# Altium footprint library NUCLEOG431RB-Custom-IN-A2212.PcbLib: 80 footprints (part 1 of 5)
Each footprint in its own frame and in the unit in brackets; x right, y up, seen from the top. Pads: shape width x height; smd on the part's side, far side on the other; paste and mask are expansions set on the pad; w line width, h text height; cw(c..) or ccw(c..) is an arc to the next point about the centre after c.
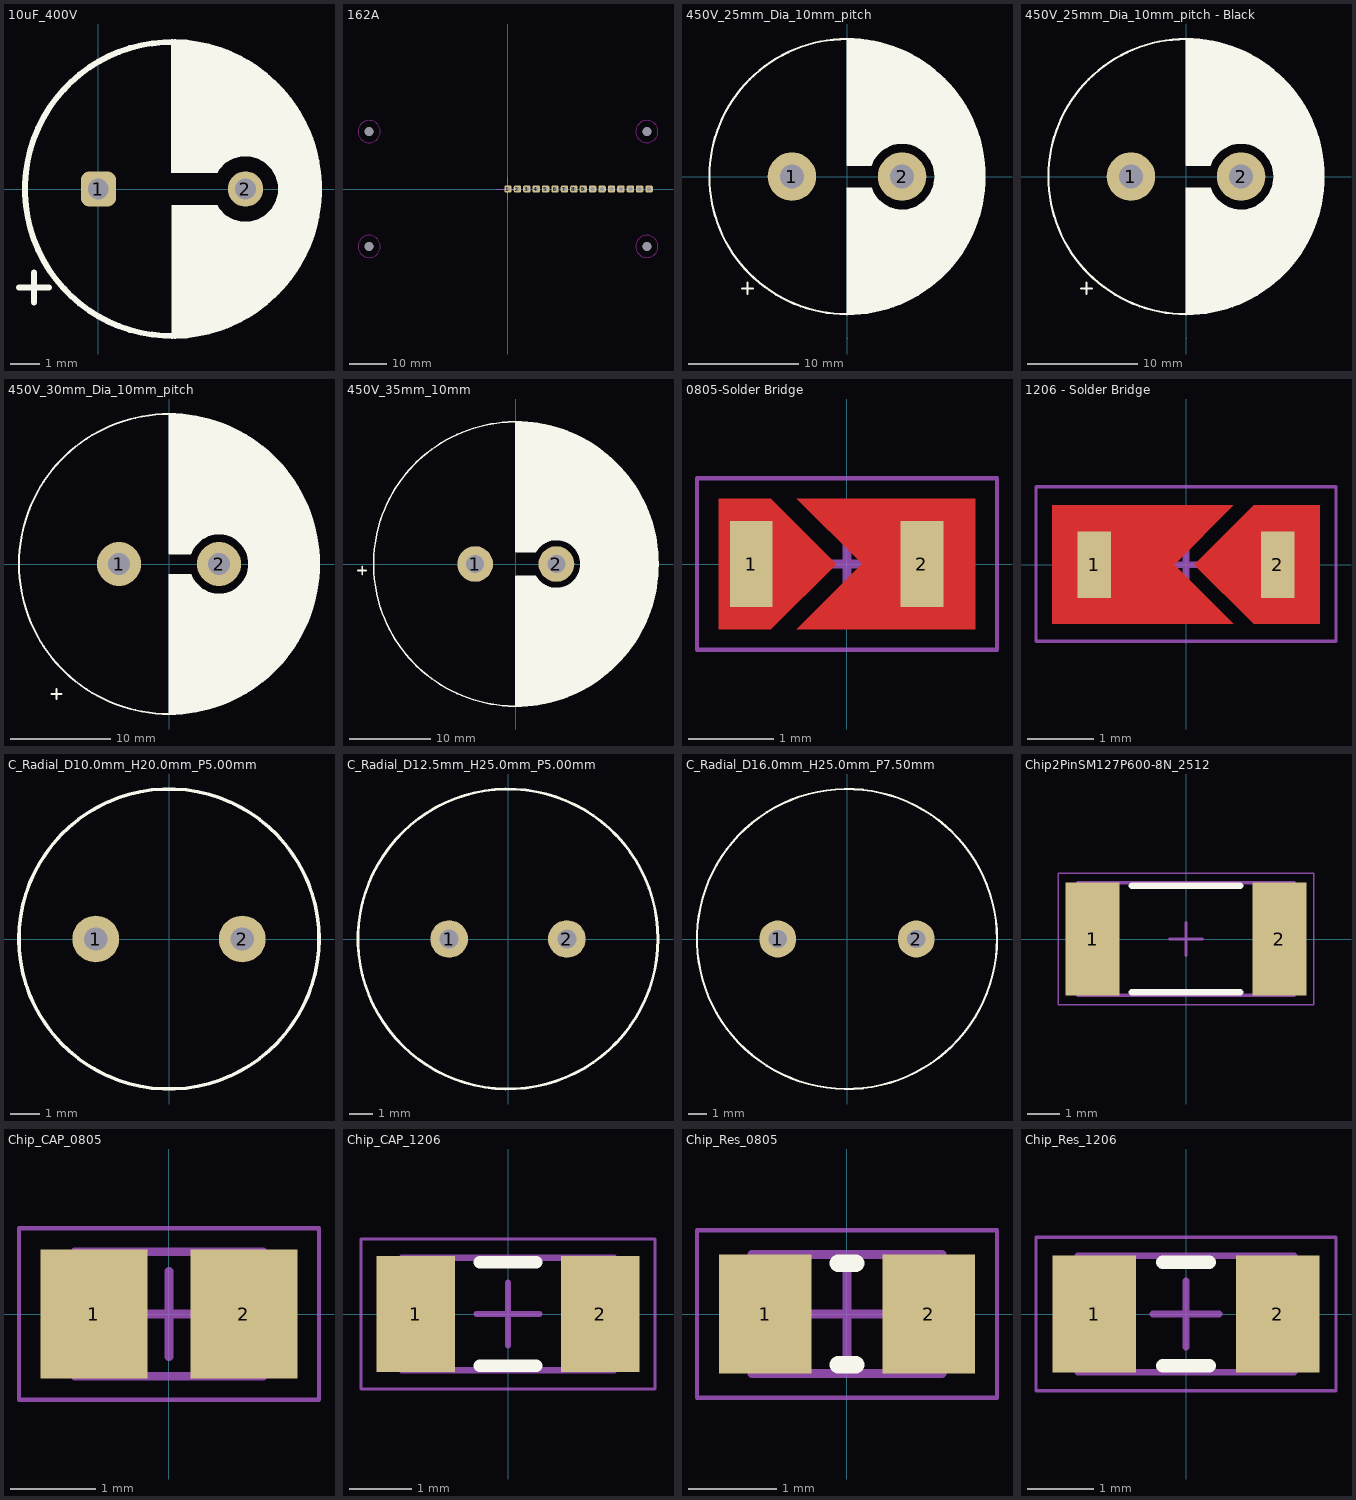
[diagram p0: the footprints below, top view; thin cyan lines are the x and y axes]

## 10uF_400V [mm]
pads (2):
  rrect50% 1.2x1.2 hole 0.7: 1(0,0)
  round 1.2 hole 0.7: 2(5,0)
Top Overlay:
  circle w0.2: c2.5,0 r5
  region: 2.5,-5 2.828,-5 3.478,-4.914 4.111,-4.745 4.716,-4.494 5.284,-4.166 5.804,-3.767 6.267,-3.304 6.666,-2.784 6.994,-2.216 7.245,-1.611 7.414,-0.978 7.5,-0.328 7.5,0.328 7.414,0.978 7.245,1.611 6.994,2.216 6.666,2.784 6.267,3.304 5.804,3.767 5.284,4.166 4.716,4.494 4.111,4.745 3.478,4.914 2.828,5 2.5,5 2.477,4.977 2.477,0.559 4.033,0.559 4.114,0.68 4.32,0.886 4.572,1.032 4.854,1.108 5.146,1.108 5.428,1.032 5.68,0.886 5.886,0.68 6.032,0.428 6.108,0.146 6.108,-0.146 6.032,-0.428 5.886,-0.68 5.68,-0.886 5.428,-1.032 5.146,-1.108 4.854,-1.108 4.572,-1.032 4.32,-0.886 4.114,-0.68 4.033,-0.559 2.5,-0.559
  lines w0.2: -2.702,-3.35 -1.686,-3.35 ; -2.194,-3.858 -2.194,-2.842 ; 2.5,-5 ccw(c2.5,0) 2.5,5
Mechanical 13:
  text "'.Designator'" at -6.328,6.764 h1.52
3D body "CP_Radial_D10.0mm_P5.00mm.step": height 10.5, standoff -1.5, extent -2.5,-4.999 7.5,5

## 162A [mm]
pads (20):
  rrect50% 2x2 hole 1.1: 1(0,0) 2(2.54,0) 3(5.08,0) 4(7.62,0) 5(10.16,0) 6(12.7,0) 7(15.24,0) 8(17.78,0) 9(20.32,0) 10(22.86,0) 11(25.4,0) 12(27.94,0) 13(30.48,0) 14(33.02,0) 15(35.56,0) 16(38.1,0)
  round 2.3 hole 2.5 unplated: M1(-37.5,15.5) M2(37.5,15.5) M3(-37.5,-15.5) M4(37.5,-15.5)
Keep-Out Layer:
  circle w0.2: c-37.5,15.5 r3
  circle w0.2: c-37.5,-15.5 r3
  circle w0.2: c37.5,-15.5 r3
  circle w0.2: c37.5,15.5 r3
Mechanical 15:
  lines w0.254: -3,0 3,0 ; 0,-3 0,3
3D body "LCD.x_t": height 25.2, standoff 0.3, extent -40.908,-18.762 40.964,18.857

## 450V_25mm_Dia_10mm_pitch [mm]
pads (2):
  round 4.4 hole 2.2: 1(-5,0) 2(5,0)
Top Overlay:
  circle w0.2: c0,0 r12.5
  region: 0,-12.5 0.546,-12.5 1.633,-12.405 2.708,-12.215 3.762,-11.933 4.788,-11.559 5.777,-11.098 6.723,-10.552 7.617,-9.926 8.453,-9.225 9.225,-8.453 9.926,-7.617 10.552,-6.723 11.098,-5.777 11.559,-4.788 11.933,-3.762 12.215,-2.708 12.405,-1.633 12.5,-0.546 12.5,0.546 12.405,1.633 12.215,2.708 11.933,3.762 11.559,4.788 11.098,5.777 10.552,6.723 9.926,7.617 9.225,8.453 8.453,9.225 7.617,9.926 6.723,10.552 5.777,11.098 4.788,11.559 3.762,11.933 2.708,12.215 1.633,12.405 0.546,12.5 0,12.5 0,1.026 2.181,1.026 2.281,1.268 2.543,1.721 2.879,2.121 3.279,2.457 3.732,2.719 4.224,2.898 4.739,2.989 5.261,2.989 5.776,2.898 6.268,2.719 6.721,2.457 7.121,2.121 7.457,1.721 7.719,1.268 7.898,0.776 7.989,0.261 7.989,-0.261 7.898,-0.776 7.719,-1.268 7.457,-1.721 7.121,-2.121 6.721,-2.457 6.268,-2.719 5.776,-2.898 5.261,-2.989 4.739,-2.989 4.224,-2.898 3.732,-2.719 3.279,-2.457 2.879,-2.121 2.543,-1.721 2.281,-1.268 2.181,-1.026 0,-1.026
  lines w0.05: 0,-14.75 0,-14.724 ; 0,-12.5 0,-1.026 2.181,-1.026 ccw(c5,0) 2.181,1.026 0,1.026 0,12.5
  lines w0.2: -9.543,-10.15 -8.527,-10.15 ; -9.035,-10.658 -9.035,-9.642
3D body "User Library-CE_R530_D1000_H1750.STEP": height 42.2, standoff -4, extent -12.7,-12.7 12.7,12.7

## 450V_25mm_Dia_10mm_pitch - Black [mm]
pads (2):
  round 4.4 hole 2.2: 1(-5,0) 2(5,0)
Top Overlay:
  circle w0.2: c0,0 r12.5
  region: 0,-12.5 0.546,-12.5 1.633,-12.405 2.708,-12.215 3.762,-11.933 4.788,-11.559 5.777,-11.098 6.723,-10.552 7.617,-9.926 8.453,-9.225 9.225,-8.453 9.926,-7.617 10.552,-6.723 11.098,-5.777 11.559,-4.788 11.933,-3.762 12.215,-2.708 12.405,-1.633 12.5,-0.546 12.5,0.546 12.405,1.633 12.215,2.708 11.933,3.762 11.559,4.788 11.098,5.777 10.552,6.723 9.926,7.617 9.225,8.453 8.453,9.225 7.617,9.926 6.723,10.552 5.777,11.098 4.788,11.559 3.762,11.933 2.708,12.215 1.633,12.405 0.546,12.5 0,12.5 0,1.026 2.181,1.026 2.281,1.268 2.543,1.721 2.879,2.121 3.279,2.457 3.732,2.719 4.224,2.898 4.739,2.989 5.261,2.989 5.776,2.898 6.268,2.719 6.721,2.457 7.121,2.121 7.457,1.721 7.719,1.268 7.898,0.776 7.989,0.261 7.989,-0.261 7.898,-0.776 7.719,-1.268 7.457,-1.721 7.121,-2.121 6.721,-2.457 6.268,-2.719 5.776,-2.898 5.261,-2.989 4.739,-2.989 4.224,-2.898 3.732,-2.719 3.279,-2.457 2.879,-2.121 2.543,-1.721 2.281,-1.268 2.181,-1.026 0,-1.026
  lines w0.05: 0,-14.75 0,-14.724 ; 0,-12.5 0,-1.026 2.181,-1.026 ccw(c5,0) 2.181,1.026 0,1.026 0,12.5
  lines w0.2: -9.543,-10.15 -8.527,-10.15 ; -9.035,-10.658 -9.035,-9.642
3D body "25mm black.x_t": height 42.2, standoff -4, extent -12.7,-12.7 12.7,12.7

## 450V_30mm_Dia_10mm_pitch [mm]
pads (2):
  round 4.4 hole 2.2: 1(-5,0) 2(5,0)
Top Overlay:
  circle w0.2: c0,0 r15
  region: 0,-15 0.589,-15 1.764,-14.908 2.929,-14.723 4.075,-14.448 5.196,-14.084 6.285,-13.633 7.335,-13.098 8.34,-12.482 9.294,-11.789 10.19,-11.023 11.023,-10.19 11.789,-9.294 12.482,-8.34 13.098,-7.335 13.633,-6.285 14.084,-5.196 14.448,-4.075 14.723,-2.929 14.908,-1.764 15,-0.589 15,0.589 14.908,1.764 14.723,2.929 14.448,4.075 14.084,5.196 13.633,6.285 13.098,7.335 12.482,8.34 11.789,9.294 11.023,10.19 10.19,11.023 9.294,11.789 8.34,12.482 7.335,13.098 6.285,13.633 5.196,14.084 4.075,14.448 2.929,14.723 1.764,14.908 0.589,15 0,15 0,1.026 2.181,1.026 2.281,1.268 2.543,1.721 2.879,2.121 3.279,2.457 3.732,2.719 4.224,2.898 4.739,2.989 5.261,2.989 5.776,2.898 6.268,2.719 6.721,2.457 7.121,2.121 7.457,1.721 7.719,1.268 7.898,0.776 7.989,0.261 7.989,-0.261 7.898,-0.776 7.719,-1.268 7.457,-1.721 7.121,-2.121 6.721,-2.457 6.268,-2.719 5.776,-2.898 5.261,-2.989 4.739,-2.989 4.224,-2.898 3.732,-2.719 3.279,-2.457 2.879,-2.121 2.543,-1.721 2.281,-1.268 2.181,-1.026 0,-1.026
  lines w0.05: 0,15 0,1.026 2.181,1.026 cw(c5,0) 2.181,-1.026 0,-1.026 0,-15 0,-14.974 0.026,-14.948
  lines w0.2: -11.768,-13 -10.752,-13 ; -11.26,-13.508 -11.26,-12.492
3D body "User Library-Assy_CE_R400_D1200_H1450.STEP": height 37.33, standoff -6.39, extent -15.343,-15.303 15.137,15.177

## 450V_35mm_10mm [mm]
pads (2):
  round 4.4 hole 2.2: 1(-5,0) 2(5,0)
Top Overlay:
  circle w0.2: c0,0 r17.5
  region: 0,-17.5 0.625,-17.5 1.872,-17.411 3.109,-17.233 4.331,-16.967 5.53,-16.615 6.701,-16.178 7.838,-15.659 8.936,-15.06 9.987,-14.384 10.988,-13.635 11.933,-12.817 12.817,-11.933 13.635,-10.988 14.384,-9.987 15.06,-8.936 15.659,-7.838 16.178,-6.701 16.615,-5.53 16.967,-4.331 17.233,-3.109 17.411,-1.872 17.5,-0.625 17.5,0.625 17.411,1.872 17.233,3.109 16.967,4.331 16.615,5.53 16.178,6.701 15.659,7.838 15.06,8.936 14.384,9.987 13.635,10.988 12.817,11.933 11.933,12.817 10.988,13.635 9.987,14.384 8.936,15.06 7.838,15.659 6.701,16.178 5.53,16.615 4.331,16.967 3.109,17.233 1.872,17.411 0.625,17.5 0,17.5 0,1.5 2.402,1.5 2.533,1.707 2.844,2.086 3.213,2.41 3.629,2.669 4.082,2.856 4.56,2.968 5.049,3 5.537,2.952 6.011,2.825 6.457,2.622 6.865,2.35 7.223,2.015 7.521,1.626 7.752,1.193 7.91,0.729 7.99,0.245 7.99,-0.245 7.91,-0.729 7.752,-1.193 7.521,-1.626 7.223,-2.015 6.865,-2.35 6.457,-2.622 6.011,-2.825 5.537,-2.952 5.049,-3 4.56,-2.968 4.082,-2.856 3.629,-2.669 3.213,-2.41 2.844,-2.086 2.533,-1.707 2.402,-1.5 0,-1.5
  lines w0.2: -19.418,-0.8 -18.402,-0.8 ; -18.91,-1.308 -18.91,-0.292 ; 0,-17.5 ccw(c0,0) 0,17.5 0,1.5 2.402,1.5 cw(c5,0) 2.402,-1.5 0,-1.5 0,-17.5
3D body "35_40_EC.x_t": height 40.5, standoff -2.94, extent -17.502,-17.499 17.516,17.499

## 0805-Solder Bridge [mm]
height 1.2
pads (2):
  rect 0.5x1 smd: 1(-1.118,0) 2(0.875,0)
Top Layer:
  region: 0.178,0 -0.584,0.762 1.499,0.762 1.499,-0.762 -0.584,-0.762
  region: -1.499,-0.762 -1.499,0.762 -0.889,0.762 -0.127,0 -0.889,-0.762
Mechanical 13:
  text "'.Designator'" at -1.746,2.762 h1.52
Mechanical 15:
  lines w0.05: -1.75,-1 -1.75,1 1.75,1 1.75,-1 -1.75,-1
  lines w0.1: -0.5,0 0.5,0 ; 0,-0.5 0,0.5

## 1206 - Solder Bridge [mm]
height 0.55
pads (2):
  rect 0.5x1 smd: 1(-1.375,0) 2(1.375,0)
Top Layer:
  region: -2.007,-0.889 0.711,-0.889 -0.178,0 0.711,0.889 -2.007,0.889
  region: 0.127,0 1.016,-0.889 2.007,-0.889 2.007,0.889 1.016,0.889
Mechanical 13:
  text "'.Designator'" at -7.01,-3.48 h1.52
Mechanical 15:
  lines w0.05: -2.25,-1.15 -2.25,1.168 2.25,1.168 2.25,-1.15 -2.25,-1.15
  lines w0.1: -0.5,0 0.5,0 ; 0,-0.5 0,0.5

## C_Radial_D10.0mm_H20.0mm_P5.00mm [mm]
pads (2):
  round 1.6 hole 0.8 paste-1.6 mask+0.05: 1(-2.5,0) 2(2.5,0)
Top Overlay:
  circle w0.12: c0,0 r5.12
3D body "C_Radial_D10.0mm_H20.0mm_P5.00mm.step": height 20, standoff -2, extent -5,-5 5,5

## C_Radial_D12.5mm_H25.0mm_P5.00mm [mm]
pads (2):
  round 1.6 hole 0.8 paste-1.6 mask+0.05: 1(-2.5,0) 2(2.5,0)
Top Overlay:
  circle w0.12: c0,0 r6.37
3D body "C_Radial_D12.5mm_H25.0mm_P5.00mm.step": height 25, standoff -2, extent -6.25,-6.246 6.25,6.249

## C_Radial_D16.0mm_H25.0mm_P7.50mm [mm]
pads (2):
  round 2 hole 1 paste-2 mask+0.05: 1(-3.75,0) 2(3.75,0)
Top Overlay:
  circle w0.12: c0,0 r8.12
3D body "C_Radial_D16.0mm_H25.0mm_P7.50mm.step": height 25, standoff -2, extent -8,-8 8,8

## Chip2PinSM127P600-8N_2512 [mm]
height 0.8
pads (2):
  rect 1.65x3.45 smd: 1(-2.85,0) 2(2.85,0)
Top Overlay:
  lines w0.2: -1.65,-1.625 1.65,-1.625 ; -1.65,1.625 1.65,1.625
Mechanical 13:
  lines w0.1: -3.3,-1.715 3.3,-1.715 3.3,1.715 -3.3,1.715 -3.3,-1.715
Mechanical 15:
  lines w0.05: -3.9,-2 3.9,-2 3.9,2 -3.9,2 -3.9,-2
  lines w0.1: -0.5,0 0.5,0 ; 0,-0.5 0,0.5
3D body "Chip2PinSM127P600-8N_2512.step": height 0.8, standoff 0, extent -3.3,-1.715 3.3,1.715

## Chip_CAP_0805 [mm]
height 1.2
pads (2):
  rect 1.25x1.5 smd: 1(-0.875,0) 2(0.875,0)
Mechanical 13:
  lines w0.1: -1.1,-0.725 1.1,-0.725 1.1,0.725 -1.1,0.725 -1.1,-0.725
  text "'.Designator'" at -1.746,2.762 h1.52
Mechanical 15:
  lines w0.05: -1.75,-1 1.75,-1 1.75,1 -1.75,1 -1.75,-1
  lines w0.1: -0.5,0 0.5,0 ; 0,-0.5 0,0.5
3D body "Chip_CAP_0805.step": height 1.2, standoff 0, extent -1.1,-0.725 1.1,0.725

## Chip_CAP_1206 [mm]
height 1.4
pads (2):
  rect 1.25x1.85 smd: 1(-1.475,0) 2(1.475,0)
Top Overlay:
  lines w0.2: -0.45,-0.825 0.45,-0.825 ; -0.45,0.825 0.45,0.825
Mechanical 13:
  lines w0.1: -1.7,-0.9 -1.7,0.9 1.7,0.9 1.7,-0.9 -1.7,-0.9
  text "'.Designator'" at -6.166,2.24 h1.52
Mechanical 15:
  lines w0.05: -2.35,-1.2 -2.35,1.2 2.35,1.2 2.35,-1.2 -2.35,-1.2
  lines w0.1: -0.5,0 0.5,0 ; 0,-0.5 0,0.5
3D body "Chip_CAP_1206.step": height 1.4, standoff 0, extent -1.7,-0.9 1.7,0.9

## Chip_Res_0805 [mm]
height 0.5
pads (2):
  rect 1.05x1.35 smd: 1(-0.925,0) 2(0.925,0)
Top Overlay:
  lines w0.2: -0.1,-0.575 0.1,-0.575 ; -0.1,0.575 0.1,0.575
Mechanical 13:
  lines w0.1: -1.075,-0.675 1.075,-0.675 1.075,0.675 -1.075,0.675 -1.075,-0.675
  text "'.Designator'" at -5.404,-2.84 h1.52
Mechanical 15:
  lines w0.05: -1.7,-0.95 1.7,-0.95 1.7,0.95 -1.7,0.95 -1.7,-0.95
  lines w0.1: -0.5,0 0.5,0 ; 0,-0.5 0,0.5
3D body "Chip_Res_0805.step": height 0.5, standoff 0, extent -1.075,-0.675 1.075,0.675

## Chip_Res_1206 [mm]
height 0.55
pads (2):
  rect 1.25x1.75 smd: 1(-1.375,0) 2(1.375,0)
Top Overlay:
  lines w0.2: -0.35,-0.775 0.35,-0.775 ; -0.35,0.775 0.35,0.775
Mechanical 13:
  lines w0.1: -1.625,-0.875 1.625,-0.875 1.625,0.875 -1.625,0.875 -1.625,-0.875
  text "'.Designator'" at -6.604,-3.048 h1.52
Mechanical 15:
  lines w0.05: -2.25,-1.15 2.25,-1.15 2.25,1.15 -2.25,1.15 -2.25,-1.15
  lines w0.1: -0.5,0 0.5,0 ; 0,-0.5 0,0.5
3D body "Chip_Res_1206.step": height 0.55, standoff 0, extent -1.625,-0.875 1.625,0.875